# Altium footprint library CONN_W2B.PcbLib: 60 footprints (part 2 of 4)
Each footprint in its own frame and in the unit in brackets; x right, y up, seen from the top. Pads: shape width x height; smd on the part's side, far side on the other; paste and mask are expansions set on the pad; w line width, h text height; cw(c..) or ccw(c..) is an arc to the next point about the centre after c.
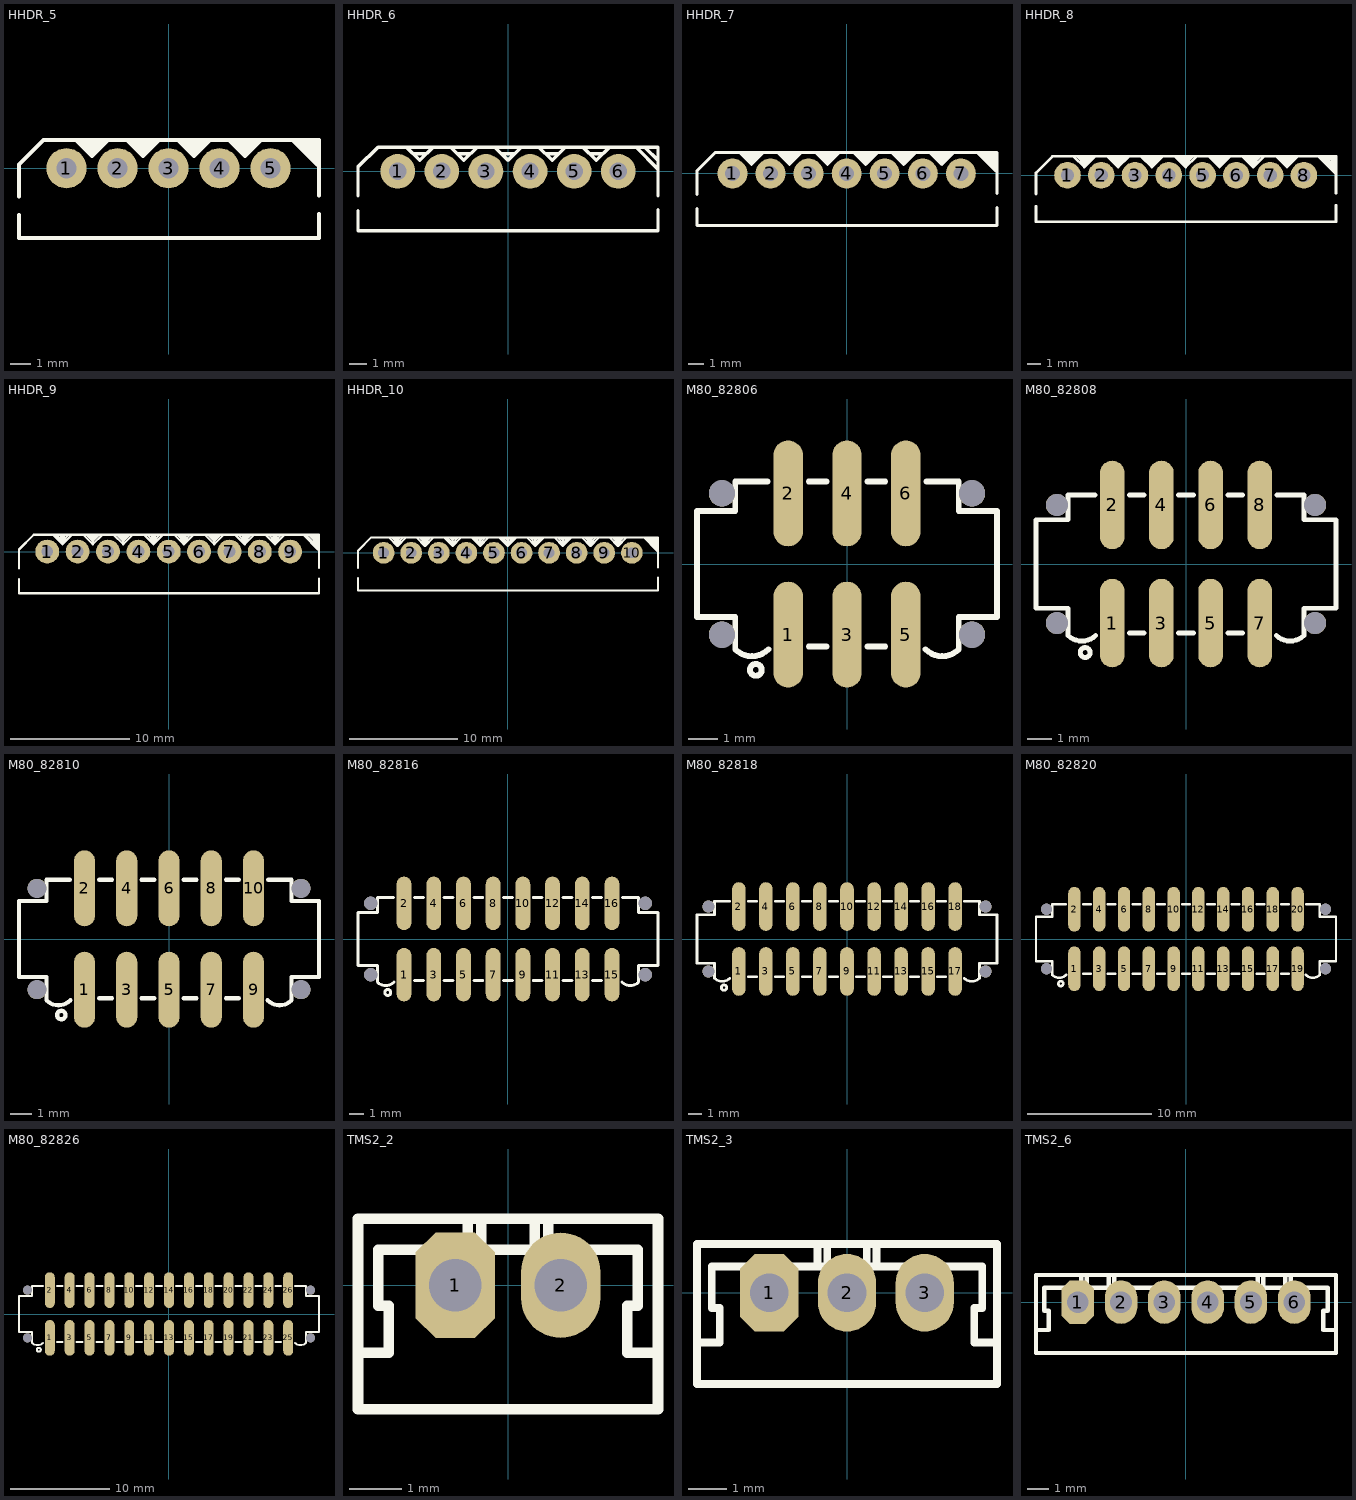
[diagram p1: the footprints below, top view; thin cyan lines are the x and y axes]

## HHDR_5 [mm]
pads (5):
  round 2 hole 1: 1(-5.08,0) 2(-2.54,0) 3(0,0) 4(2.54,0) 5(5.08,0)
Top Overlay:
  lines w0.2: -7.445,-2.325 -7.445,-3.485 7.493,-3.485 7.493,-2.269 ; -7.445,-1.405 -7.445,0.185 -6.215,1.415 7.493,1.415 7.493,-1.349 ; -4.61,1.415 -3.81,0.615 ; -4.336,1.415 -3.81,0.889 -3.284,1.415 ; -4.082,1.415 -3.81,1.143 -3.538,1.415 ; -3.81,1.415 -3.81,0.615 ; -3.01,1.415 -3.81,0.615 ; -2.07,1.415 -1.27,0.615 ; -1.796,1.415 -1.27,0.889 -0.744,1.415 ; -1.542,1.415 -1.27,1.143 -0.998,1.415 ; -1.27,1.415 -1.27,0.615 ; -0.47,1.415 -1.27,0.615 ; 0.47,1.415 1.27,0.615 ; 0.744,1.415 1.27,0.889 1.796,1.415 ; 0.998,1.415 1.27,1.143 1.542,1.415 ; 1.27,1.415 1.27,0.615 ; 2.07,1.415 1.27,0.615 ; 3.01,1.415 3.81,0.615 ; 3.284,1.415 3.81,0.889 4.336,1.415 ; 3.538,1.415 3.81,1.143 4.082,1.415 ; 3.81,1.415 3.81,0.615 ; 4.61,1.415 3.81,0.615 ; 6.175,1.415 7.405,0.185 ; 6.389,1.415 7.405,0.399 7.405,0.653 6.643,1.415 6.897,1.415 7.405,0.907 7.405,1.161 7.151,1.415

## HHDR_6 [mm]
pads (6):
  round 2 hole 1: 1(-6.35,0) 2(-3.81,0) 3(-1.27,0) 4(1.27,0) 5(3.81,0) 6(6.35,0)
Top Overlay:
  lines w0.2: -8.636,-2.269 -8.636,-3.429 8.636,-3.429 8.636,-2.213 ; -8.636,-1.397 -8.636,0.254 -7.485,1.397 8.636,1.397 8.636,-1.397 ; -5.842,1.397 -5.08,0.635 -4.318,1.397 ; -5.461,1.016 -4.699,1.016 ; -3.302,1.397 -2.54,0.635 -1.778,1.397 ; -2.921,1.016 -2.159,1.016 ; -0.762,1.397 0,0.635 0.762,1.397 ; -0.381,1.016 0.381,1.016 ; 1.778,1.397 2.54,0.635 3.302,1.397 ; 2.159,1.016 2.921,1.016 ; 4.318,1.397 5.08,0.635 5.842,1.397 ; 4.699,1.016 5.461,1.016 ; 7.406,1.357 8.636,0.127 ; 7.874,1.397 8.636,0.635

## HHDR_7 [mm]
pads (7):
  round 2 hole 1: 1(-7.62,0) 2(-5.08,0) 3(-2.54,0) 4(0,0) 5(2.54,0) 6(5.08,0) 7(7.62,0)
Top Overlay:
  lines w0.2: -9.985,-2.325 -9.985,-3.485 10.033,-3.485 10.033,-2.269 ; -9.985,-1.405 -9.985,0.185 -8.755,1.415 10.033,1.415 10.033,-1.349 ; -7.15,1.415 -6.35,0.615 ; -6.876,1.415 -6.35,0.889 -5.824,1.415 ; -6.622,1.415 -6.35,1.143 -6.078,1.415 ; -6.35,1.415 -6.35,0.615 ; -5.55,1.415 -6.35,0.615 ; -4.61,1.415 -3.81,0.615 ; -4.336,1.415 -3.81,0.889 -3.284,1.415 ; -4.082,1.415 -3.81,1.143 -3.538,1.415 ; -3.81,1.415 -3.81,0.615 ; -3.01,1.415 -3.81,0.615 ; -2.07,1.415 -1.27,0.615 ; -1.796,1.415 -1.27,0.889 -0.744,1.415 ; -1.542,1.415 -1.27,1.143 -0.998,1.415 ; -1.27,1.415 -1.27,0.615 ; -0.47,1.415 -1.27,0.615 ; 0.47,1.415 1.27,0.615 ; 0.744,1.415 1.27,0.889 1.796,1.415 ; 0.998,1.415 1.27,1.143 1.542,1.415 ; 1.27,1.415 1.27,0.615 ; 2.07,1.415 1.27,0.615 ; 3.01,1.415 3.81,0.615 ; 3.284,1.415 3.81,0.889 4.336,1.415 ; 3.538,1.415 3.81,1.143 4.082,1.415 ; 3.81,1.415 3.81,0.615 ; 4.61,1.415 3.81,0.615 ; 5.55,1.415 6.35,0.615 ; 5.824,1.415 6.35,0.889 6.876,1.415 ; 6.078,1.415 6.35,1.143 6.622,1.415 ; 6.35,1.415 6.35,0.615 ; 7.15,1.415 6.35,0.615 ; 8.715,1.415 9.945,0.185 ; 8.929,1.415 9.945,0.399 9.945,0.653 9.183,1.415 9.437,1.415 9.945,0.907 9.945,1.161 9.691,1.415

## HHDR_8 [mm]
pads (8):
  round 2 hole 1: 1(-8.89,0) 2(-6.35,0) 3(-3.81,0) 4(-1.27,0) 5(1.27,0) 6(3.81,0) 7(6.35,0) 8(8.89,0)
Top Overlay:
  lines w0.2: -11.255,-2.325 -11.255,-3.485 11.303,-3.485 11.303,-2.269 ; -11.255,-1.405 -11.255,0.185 -10.025,1.415 11.303,1.415 11.303,-1.349 ; -8.42,1.415 -7.62,0.615 ; -8.146,1.415 -7.62,0.889 -7.094,1.415 ; -7.892,1.415 -7.62,1.143 -7.348,1.415 ; -7.62,1.415 -7.62,0.615 ; -6.82,1.415 -7.62,0.615 ; -5.88,1.415 -5.08,0.615 ; -5.606,1.415 -5.08,0.889 -4.554,1.415 ; -5.352,1.415 -5.08,1.143 -4.808,1.415 ; -5.08,1.415 -5.08,0.615 ; -4.28,1.415 -5.08,0.615 ; -3.34,1.415 -2.54,0.615 ; -3.066,1.415 -2.54,0.889 -2.014,1.415 ; -2.812,1.415 -2.54,1.143 -2.268,1.415 ; -2.54,1.415 -2.54,0.615 ; -1.74,1.415 -2.54,0.615 ; -0.8,1.415 0,0.615 ; -0.526,1.415 0,0.889 0.526,1.415 ; -0.272,1.415 0,1.143 0.272,1.415 ; 0,1.415 0,0.615 ; 0.8,1.415 0,0.615 ; 1.74,1.415 2.54,0.615 ; 2.014,1.415 2.54,0.889 3.066,1.415 ; 2.268,1.415 2.54,1.143 2.812,1.415 ; 2.54,1.415 2.54,0.615 ; 3.34,1.415 2.54,0.615 ; 4.28,1.415 5.08,0.615 ; 4.554,1.415 5.08,0.889 5.606,1.415 ; 4.808,1.415 5.08,1.143 5.352,1.415 ; 5.08,1.415 5.08,0.615 ; 5.88,1.415 5.08,0.615 ; 6.82,1.415 7.62,0.615 ; 7.094,1.415 7.62,0.889 8.146,1.415 ; 7.348,1.415 7.62,1.143 7.892,1.415 ; 7.62,1.415 7.62,0.615 ; 8.42,1.415 7.62,0.615 ; 9.985,1.415 11.215,0.185 ; 10.199,1.415 11.215,0.399 11.215,0.653 10.453,1.415 10.707,1.415 11.215,0.907 11.215,1.161 10.961,1.415

## HHDR_9 [mm]
pads (9):
  round 2 hole 1: 1(-10.16,0) 2(-7.62,0) 3(-5.08,0) 4(-2.54,0) 5(0,0) 6(2.54,0) 7(5.08,0) 8(7.62,0) 9(10.16,0)
Top Overlay:
  lines w0.2: -12.525,-2.325 -12.525,-3.485 12.573,-3.485 12.573,-2.269 ; -12.525,-1.405 -12.525,0.185 -11.295,1.415 12.573,1.415 12.573,-1.349 ; -9.69,1.415 -8.89,0.615 ; -9.416,1.415 -8.89,0.889 -8.364,1.415 ; -9.162,1.415 -8.89,1.143 -8.618,1.415 ; -8.89,1.415 -8.89,0.615 ; -8.09,1.415 -8.89,0.615 ; -7.15,1.415 -6.35,0.615 ; -6.876,1.415 -6.35,0.889 -5.824,1.415 ; -6.622,1.415 -6.35,1.143 -6.078,1.415 ; -6.35,1.415 -6.35,0.615 ; -5.55,1.415 -6.35,0.615 ; -4.61,1.415 -3.81,0.615 ; -4.336,1.415 -3.81,0.889 -3.284,1.415 ; -4.082,1.415 -3.81,1.143 -3.538,1.415 ; -3.81,1.415 -3.81,0.615 ; -3.01,1.415 -3.81,0.615 ; -2.07,1.415 -1.27,0.615 ; -1.796,1.415 -1.27,0.889 -0.744,1.415 ; -1.542,1.415 -1.27,1.143 -0.998,1.415 ; -1.27,1.415 -1.27,0.615 ; -0.47,1.415 -1.27,0.615 ; 0.47,1.415 1.27,0.615 ; 0.744,1.415 1.27,0.889 1.796,1.415 ; 0.998,1.415 1.27,1.143 1.542,1.415 ; 1.27,1.415 1.27,0.615 ; 2.07,1.415 1.27,0.615 ; 3.01,1.415 3.81,0.615 ; 3.284,1.415 3.81,0.889 4.336,1.415 ; 3.538,1.415 3.81,1.143 4.082,1.415 ; 3.81,1.415 3.81,0.615 ; 4.61,1.415 3.81,0.615 ; 5.55,1.415 6.35,0.615 ; 5.824,1.415 6.35,0.889 6.876,1.415 ; 6.078,1.415 6.35,1.143 6.622,1.415 ; 6.35,1.415 6.35,0.615 ; 7.15,1.415 6.35,0.615 ; 8.09,1.415 8.89,0.615 ; 8.364,1.415 8.89,0.889 9.416,1.415 ; 8.618,1.415 8.89,1.143 9.162,1.415 ; 8.89,1.415 8.89,0.615 ; 9.69,1.415 8.89,0.615 ; 11.255,1.415 12.485,0.185 ; 11.469,1.415 12.485,0.399 12.485,0.653 11.723,1.415 11.977,1.415 12.485,0.907 12.485,1.161 12.231,1.415

## HHDR_10 [mm]
pads (10):
  round 2 hole 1: 1(-11.43,0) 2(-8.89,0) 3(-6.35,0) 4(-3.81,0) 5(-1.27,0) 6(1.27,0) 7(3.81,0) 8(6.35,0) 9(8.89,0) 10(11.43,0)
Top Overlay:
  lines w0.2: -13.795,-2.325 -13.795,-3.485 13.843,-3.485 13.843,-2.269 ; -13.795,-1.405 -13.795,0.185 -12.565,1.415 13.843,1.415 13.843,-1.349 ; -10.96,1.415 -10.16,0.615 ; -10.686,1.415 -10.16,0.889 -9.634,1.415 ; -10.432,1.415 -10.16,1.143 -9.888,1.415 ; -10.16,1.415 -10.16,0.615 ; -9.36,1.415 -10.16,0.615 ; -8.42,1.415 -7.62,0.615 ; -8.146,1.415 -7.62,0.889 -7.094,1.415 ; -7.892,1.415 -7.62,1.143 -7.348,1.415 ; -7.62,1.415 -7.62,0.615 ; -6.82,1.415 -7.62,0.615 ; -5.88,1.415 -5.08,0.615 ; -5.606,1.415 -5.08,0.889 -4.554,1.415 ; -5.352,1.415 -5.08,1.143 -4.808,1.415 ; -5.08,1.415 -5.08,0.615 ; -4.28,1.415 -5.08,0.615 ; -3.34,1.415 -2.54,0.615 ; -3.066,1.415 -2.54,0.889 -2.014,1.415 ; -2.812,1.415 -2.54,1.143 -2.268,1.415 ; -2.54,1.415 -2.54,0.615 ; -1.74,1.415 -2.54,0.615 ; -0.8,1.415 0,0.615 ; -0.526,1.415 0,0.889 0.526,1.415 ; -0.272,1.415 0,1.143 0.272,1.415 ; 0,1.415 0,0.615 ; 0.8,1.415 0,0.615 ; 1.74,1.415 2.54,0.615 ; 2.014,1.415 2.54,0.889 3.066,1.415 ; 2.268,1.415 2.54,1.143 2.812,1.415 ; 2.54,1.415 2.54,0.615 ; 3.34,1.415 2.54,0.615 ; 4.28,1.415 5.08,0.615 ; 4.554,1.415 5.08,0.889 5.606,1.415 ; 4.808,1.415 5.08,1.143 5.352,1.415 ; 5.08,1.415 5.08,0.615 ; 5.88,1.415 5.08,0.615 ; 6.82,1.415 7.62,0.615 ; 7.094,1.415 7.62,0.889 8.146,1.415 ; 7.348,1.415 7.62,1.143 7.892,1.415 ; 7.62,1.415 7.62,0.615 ; 8.42,1.415 7.62,0.615 ; 9.36,1.415 10.16,0.615 ; 9.634,1.415 10.16,0.889 10.686,1.415 ; 9.888,1.415 10.16,1.143 10.432,1.415 ; 10.16,1.415 10.16,0.615 ; 10.96,1.415 10.16,0.615 ; 12.525,1.415 13.755,0.185 ; 12.739,1.415 13.755,0.399 13.755,0.653 12.993,1.415 13.247,1.415 13.755,0.907 13.755,1.161 13.501,1.415

## M80_82806 [mm] "M80-82806 Harwin Datamate 2mm Male"
pads (10):
  oval 1x3.6 smd: 1(-2,-2.4) 2(-2,2.4) 3(0,-2.4) 4(0,2.4) 5(2,-2.4) 6(2,2.4)
  round 0.9 hole 0.9 unplated: ""(-4.25,-2.4) ""(-4.25,2.4) ""(4.25,-2.4) ""(4.25,2.4)
Top Overlay:
  circle w0.2: c-3.1,-3.6 r0.2
  lines w0.2: -2.7,2.8 -3.8,2.8 -3.8,1.8 -5.1,1.8 -5.1,-1.8 -3.8,-1.8 -3.8,-2.9 ccw(c-3.234,-2.334) -2.669,-2.9 ; -1.3,-2.8 -0.7,-2.8 ; -1.3,2.8 -0.7,2.8 ; 0.7,-2.8 1.3,-2.8 ; 0.7,2.8 1.3,2.8 ; 2.669,-2.9 ccw(c3.234,-2.334) 3.8,-2.9 3.8,-1.8 5.1,-1.8 5.1,1.8 3.8,1.8 3.8,2.8 2.7,2.8
3D body "m80-8280642_asm.stp": height 9, standoff 0.04, extent -4.95,-3.781 4.95,3.781

## M80_82808 [mm] "M80-8280842 Harwin Datamate 2mm Male"
pads (12):
  oval 1x3.6 smd: 1(-3,-2.4) 2(-3,2.4) 3(-1,-2.4) 4(-1,2.4) 5(1,-2.4) 6(1,2.4) 7(3,-2.4) 8(3,2.4)
  round 0.9 hole 0.9 unplated: ""(-5.25,-2.4) ""(-5.25,2.4) ""(5.25,-2.4) ""(5.25,2.4)
Top Overlay:
  circle w0.2: c-4.1,-3.6 r0.2
  lines w0.2: -3.7,2.8 -4.8,2.8 -4.8,1.8 -6.1,1.8 -6.1,-1.8 -4.8,-1.8 -4.8,-2.9 ccw(c-4.234,-2.334) -3.669,-2.9 ; -2.3,-2.8 -1.7,-2.8 ; -2.3,2.8 -1.7,2.8 ; -0.3,-2.8 0.3,-2.8 ; -0.3,2.8 0.3,2.8 ; 1.7,-2.8 2.3,-2.8 ; 1.7,2.8 2.3,2.8 ; 3.669,-2.9 ccw(c4.234,-2.334) 4.8,-2.9 4.8,-1.8 6.1,-1.8 6.1,1.8 4.8,1.8 4.8,2.8 3.7,2.8
3D body "m80-8280842_asm.stp": height 9, standoff 0.04, extent -5.95,-3.781 5.95,3.781

## M80_82810 [mm] "M80-8281042 Harwin Datamate 2mm Male"
pads (14):
  oval 1x3.6 smd: 1(-4,-2.4) 2(-4,2.4) 3(-2,-2.4) 4(-2,2.4) 5(0,-2.4) 6(0,2.4) 7(2,-2.4) 8(2,2.4) 9(4,-2.4) 10(4,2.4)
  round 0.9 hole 0.9 unplated: ""(-6.25,-2.4) ""(-6.25,2.4) ""(6.25,-2.4) ""(6.25,2.4)
Top Overlay:
  circle w0.2: c-5.1,-3.6 r0.2
  lines w0.2: -4.7,2.8 -5.8,2.8 -5.8,1.8 -7.1,1.8 -7.1,-1.8 -5.8,-1.8 -5.8,-2.9 ccw(c-5.234,-2.334) -4.669,-2.9 ; -3.3,-2.8 -2.7,-2.8 ; -3.3,2.8 -2.7,2.8 ; -1.3,-2.8 -0.7,-2.8 ; -1.3,2.8 -0.7,2.8 ; 0.7,-2.8 1.3,-2.8 ; 0.7,2.8 1.3,2.8 ; 2.7,-2.8 3.3,-2.8 ; 2.7,2.8 3.3,2.8 ; 4.669,-2.9 ccw(c5.234,-2.334) 5.8,-2.9 5.8,-1.8 7.1,-1.8 7.1,1.8 5.8,1.8 5.8,2.8 4.7,2.8
3D body "m80-8281042_asm.stp": height 9, standoff 0.04, extent -6.95,-3.781 6.95,3.781

## M80_82816 [mm] "M80-8281642 Harwin Datamate 2mm Male"
pads (20):
  oval 1x3.6 smd: 1(-7,-2.4) 2(-7,2.4) 3(-5,-2.4) 4(-5,2.4) 5(-3,-2.4) 6(-3,2.4) 7(-1,-2.4) 8(-1,2.4) 9(1,-2.4) 10(1,2.4) 11(3,-2.4) 12(3,2.4) 13(5,-2.4) 14(5,2.4) 15(7,-2.4) 16(7,2.4)
  round 0.9 hole 0.9 unplated: ""(-9.25,-2.4) ""(-9.25,2.4) ""(9.25,-2.4) ""(9.25,2.4)
Top Overlay:
  circle w0.2: c-8.1,-3.6 r0.2
  lines w0.2: -7.7,2.8 -8.8,2.8 -8.8,1.8 -10.1,1.8 -10.1,-1.8 -8.8,-1.8 -8.8,-2.9 ccw(c-8.234,-2.334) -7.669,-2.9 ; -6.3,-2.8 -5.7,-2.8 ; -6.3,2.8 -5.7,2.8 ; -4.3,-2.8 -3.7,-2.8 ; -4.3,2.8 -3.7,2.8 ; -2.3,-2.8 -1.7,-2.8 ; -2.3,2.8 -1.7,2.8 ; -0.3,-2.8 0.3,-2.8 ; -0.3,2.8 0.3,2.8 ; 1.7,-2.8 2.3,-2.8 ; 1.7,2.8 2.3,2.8 ; 3.7,-2.8 4.3,-2.8 ; 3.7,2.8 4.3,2.8 ; 5.7,-2.8 6.3,-2.8 ; 5.7,2.8 6.3,2.8 ; 7.669,-2.9 ccw(c8.234,-2.334) 8.8,-2.9 8.8,-1.8 10.1,-1.8 10.1,1.8 8.8,1.8 8.8,2.8 7.7,2.8
3D body "m80-8281642_asm.stp": height 9, standoff 0.04, extent -9.95,-3.781 9.95,3.781

## M80_82818 [mm] "M80-8281842 Harwin Datamate 2mm Male"
pads (22):
  oval 1x3.6 smd: 1(-8,-2.4) 2(-8,2.4) 3(-6,-2.4) 4(-6,2.4) 5(-4,-2.4) 6(-4,2.4) 7(-2,-2.4) 8(-2,2.4) 9(0,-2.4) 10(0,2.4) 11(2,-2.4) 12(2,2.4) 13(4,-2.4) 14(4,2.4) 15(6,-2.4) 16(6,2.4) 17(8,-2.4) 18(8,2.4)
  round 0.9 hole 0.9 unplated: ""(-10.25,-2.4) ""(-10.25,2.4) ""(10.25,-2.4) ""(10.25,2.4)
Top Overlay:
  circle w0.2: c-9.1,-3.6 r0.2
  lines w0.2: -8.7,2.8 -9.8,2.8 -9.8,1.8 -11.1,1.8 -11.1,-1.8 -9.8,-1.8 -9.8,-2.9 ccw(c-9.234,-2.334) -8.669,-2.9 ; -7.3,-2.8 -6.7,-2.8 ; -7.3,2.8 -6.7,2.8 ; -5.3,-2.8 -4.7,-2.8 ; -5.3,2.8 -4.7,2.8 ; -3.3,-2.8 -2.7,-2.8 ; -3.3,2.8 -2.7,2.8 ; -1.3,-2.8 -0.7,-2.8 ; -1.3,2.8 -0.7,2.8 ; 0.7,-2.8 1.3,-2.8 ; 0.7,2.8 1.3,2.8 ; 2.7,-2.8 3.3,-2.8 ; 2.7,2.8 3.3,2.8 ; 4.7,-2.8 5.3,-2.8 ; 4.7,2.8 5.3,2.8 ; 6.7,-2.8 7.3,-2.8 ; 6.7,2.8 7.3,2.8 ; 8.669,-2.9 ccw(c9.234,-2.334) 9.8,-2.9 9.8,-1.8 11.1,-1.8 11.1,1.8 9.8,1.8 9.8,2.8 8.7,2.8
3D body "m80-8281842_asm.stp": height 9, standoff 0.04, extent -10.95,-3.781 10.95,3.781

## M80_82820 [mm] "M80-8282042 Harwin Datamate 2mm Male"
pads (24):
  oval 1x3.6 smd: 1(-9,-2.4) 2(-9,2.4) 3(-7,-2.4) 4(-7,2.4) 5(-5,-2.4) 6(-5,2.4) 7(-3,-2.4) 8(-3,2.4) 9(-1,-2.4) 10(-1,2.4) 11(1,-2.4) 12(1,2.4) 13(3,-2.4) 14(3,2.4) 15(5,-2.4) 16(5,2.4) 17(7,-2.4) 18(7,2.4) 19(9,-2.4) 20(9,2.4)
  round 0.9 hole 0.9 unplated: ""(-11.25,-2.4) ""(-11.25,2.4) ""(11.25,-2.4) ""(11.25,2.4)
Top Overlay:
  circle w0.2: c-10.1,-3.6 r0.2
  lines w0.2: -9.7,2.8 -10.8,2.8 -10.8,1.8 -12.1,1.8 -12.1,-1.8 -10.8,-1.8 -10.8,-2.9 ccw(c-10.234,-2.334) -9.669,-2.9 ; -8.3,-2.8 -7.7,-2.8 ; -8.3,2.8 -7.7,2.8 ; -6.3,-2.8 -5.7,-2.8 ; -6.3,2.8 -5.7,2.8 ; -4.3,-2.8 -3.7,-2.8 ; -4.3,2.8 -3.7,2.8 ; -2.3,-2.8 -1.7,-2.8 ; -2.3,2.8 -1.7,2.8 ; -0.3,-2.8 0.3,-2.8 ; -0.3,2.8 0.3,2.8 ; 1.7,-2.8 2.3,-2.8 ; 1.7,2.8 2.3,2.8 ; 3.7,-2.8 4.3,-2.8 ; 3.7,2.8 4.3,2.8 ; 5.7,-2.8 6.3,-2.8 ; 5.7,2.8 6.3,2.8 ; 7.7,-2.8 8.3,-2.8 ; 7.7,2.8 8.3,2.8 ; 9.669,-2.9 ccw(c10.234,-2.334) 10.8,-2.9 10.8,-1.8 12.1,-1.8 12.1,1.8 10.8,1.8 10.8,2.8 9.7,2.8
3D body "m80-8282042_asm.stp": height 9, standoff 0.04, extent -11.95,-3.781 11.95,3.781

## M80_82826 [mm] "M80-8282642 Harwin Datamate 2mm Male"
pads (30):
  oval 1x3.6 smd: 1(-12,-2.4) 2(-12,2.4) 3(-10,-2.4) 4(-10,2.4) 5(-8,-2.4) 6(-8,2.4) 7(-6,-2.4) 8(-6,2.4) 9(-4,-2.4) 10(-4,2.4) 11(-2,-2.4) 12(-2,2.4) 13(0,-2.4) 14(0,2.4) 15(2,-2.4) 16(2,2.4) 17(4,-2.4) 18(4,2.4) 19(6,-2.4) 20(6,2.4) 21(8,-2.4) 22(8,2.4) 23(10,-2.4) 24(10,2.4) 25(12,-2.4) 26(12,2.4)
  round 0.9 hole 0.9 unplated: ""(-14.25,-2.4) ""(-14.25,2.4) ""(14.25,-2.4) ""(14.25,2.4)
Top Overlay:
  circle w0.2: c-13.1,-3.6 r0.2
  lines w0.2: -12.7,2.8 -13.8,2.8 -13.8,1.8 -15.1,1.8 -15.1,-1.8 -13.8,-1.8 -13.8,-2.9 ccw(c-13.234,-2.334) -12.669,-2.9 ; -11.3,-2.8 -10.7,-2.8 ; -11.3,2.8 -10.7,2.8 ; -9.3,-2.8 -8.7,-2.8 ; -9.3,2.8 -8.7,2.8 ; -7.3,-2.8 -6.7,-2.8 ; -7.3,2.8 -6.7,2.8 ; -5.3,-2.8 -4.7,-2.8 ; -5.3,2.8 -4.7,2.8 ; -3.3,-2.8 -2.7,-2.8 ; -3.3,2.8 -2.7,2.8 ; -1.3,-2.8 -0.7,-2.8 ; -1.3,2.8 -0.7,2.8 ; 0.7,-2.8 1.3,-2.8 ; 0.7,2.8 1.3,2.8 ; 2.7,-2.8 3.3,-2.8 ; 2.7,2.8 3.3,2.8 ; 4.7,-2.8 5.3,-2.8 ; 4.7,2.8 5.3,2.8 ; 6.7,-2.8 7.3,-2.8 ; 6.7,2.8 7.3,2.8 ; 8.7,-2.8 9.3,-2.8 ; 8.7,2.8 9.3,2.8 ; 10.7,-2.8 11.3,-2.8 ; 10.7,2.8 11.3,2.8 ; 12.669,-2.9 ccw(c13.234,-2.334) 13.8,-2.9 13.8,-1.8 15.1,-1.8 15.1,1.8 13.8,1.8 13.8,2.8 12.7,2.8
3D body "m80-8282642_asm.stp": height 9, standoff 0.04, extent -14.95,-3.781 14.95,3.781

## TMS2_2 [mm] "pitch: 2.0mm"
pads (2):
  oct 1.5x2 hole 1: 1(-1,0)
  oval 1.5x2 hole 1: 2(1,0)
Top Overlay:
  lines w0.2: -2.845,-1.283 -2.261,-1.283 -2.261,-0.394 -2.464,-0.394 -2.464,0.673 2.464,0.673 2.464,-0.394 2.261,-0.394 2.261,-1.283 2.845,-1.283 ; -0.762,0.673 -0.762,1.257 ; -0.508,0.673 -0.508,1.257 ; 0.508,0.673 0.508,1.257 ; 0.762,0.673 0.762,1.257 ; -2.845,-2.35 -2.845,1.257 2.845,1.257 2.845,-2.35 -2.845,-2.35

## TMS2_3 [mm] "pitch: 2.0mm"
pads (3):
  oct 1.5x2 hole 1: 1(-2,0)
  oval 1.5x2 hole 1: 2(0,0) 3(2,0)
Top Overlay:
  lines w0.2: -3.861,-1.283 -3.277,-1.283 -3.277,-0.394 -3.48,-0.394 -3.48,0.673 3.48,0.673 3.48,-0.394 3.277,-0.394 3.277,-1.283 3.861,-1.283 ; -0.762,0.673 -0.762,1.257 ; -0.508,0.673 -0.508,1.257 ; 0.508,0.673 0.508,1.257 ; 0.762,0.673 0.762,1.257 ; -3.861,-2.35 3.861,-2.35 3.861,1.257 -3.861,1.257 -3.861,-2.35

## TMS2_6 [mm] "pitch: 2.0mm"
pads (6):
  oct 1.5x2 hole 1: 1(-5,0)
  oval 1.5x2 hole 1: 2(-3,0) 3(-1,0) 4(1,0) 5(3,0) 6(5,0)
Top Overlay:
  lines w0.2: -6.925,-1.283 -6.341,-1.283 -6.341,-0.394 -6.544,-0.394 -6.544,0.673 6.544,0.673 6.544,-0.394 6.341,-0.394 6.341,-1.283 6.925,-1.283 ; -4.842,0.673 -4.842,1.257 ; -4.588,0.673 -4.588,1.257 ; -3.572,0.673 -3.572,1.257 ; -3.318,0.673 -3.318,1.257 ; 3.318,0.673 3.318,1.257 ; 3.572,0.673 3.572,1.257 ; 4.588,0.673 4.588,1.257 ; 4.842,0.673 4.842,1.257 ; -6.925,-2.35 6.925,-2.35 6.925,1.257 -6.925,1.257 -6.925,-2.35